# Altium footprint library Standard2.PcbLib: 423 footprints (part 8 of 27)
Each footprint in its own frame and in the unit in brackets; x right, y up, seen from the top. Pads: shape width x height; smd on the part's side, far side on the other; paste and mask are expansions set on the pad; w line width, h text height; cw(c..) or ccw(c..) is an arc to the next point about the centre after c.
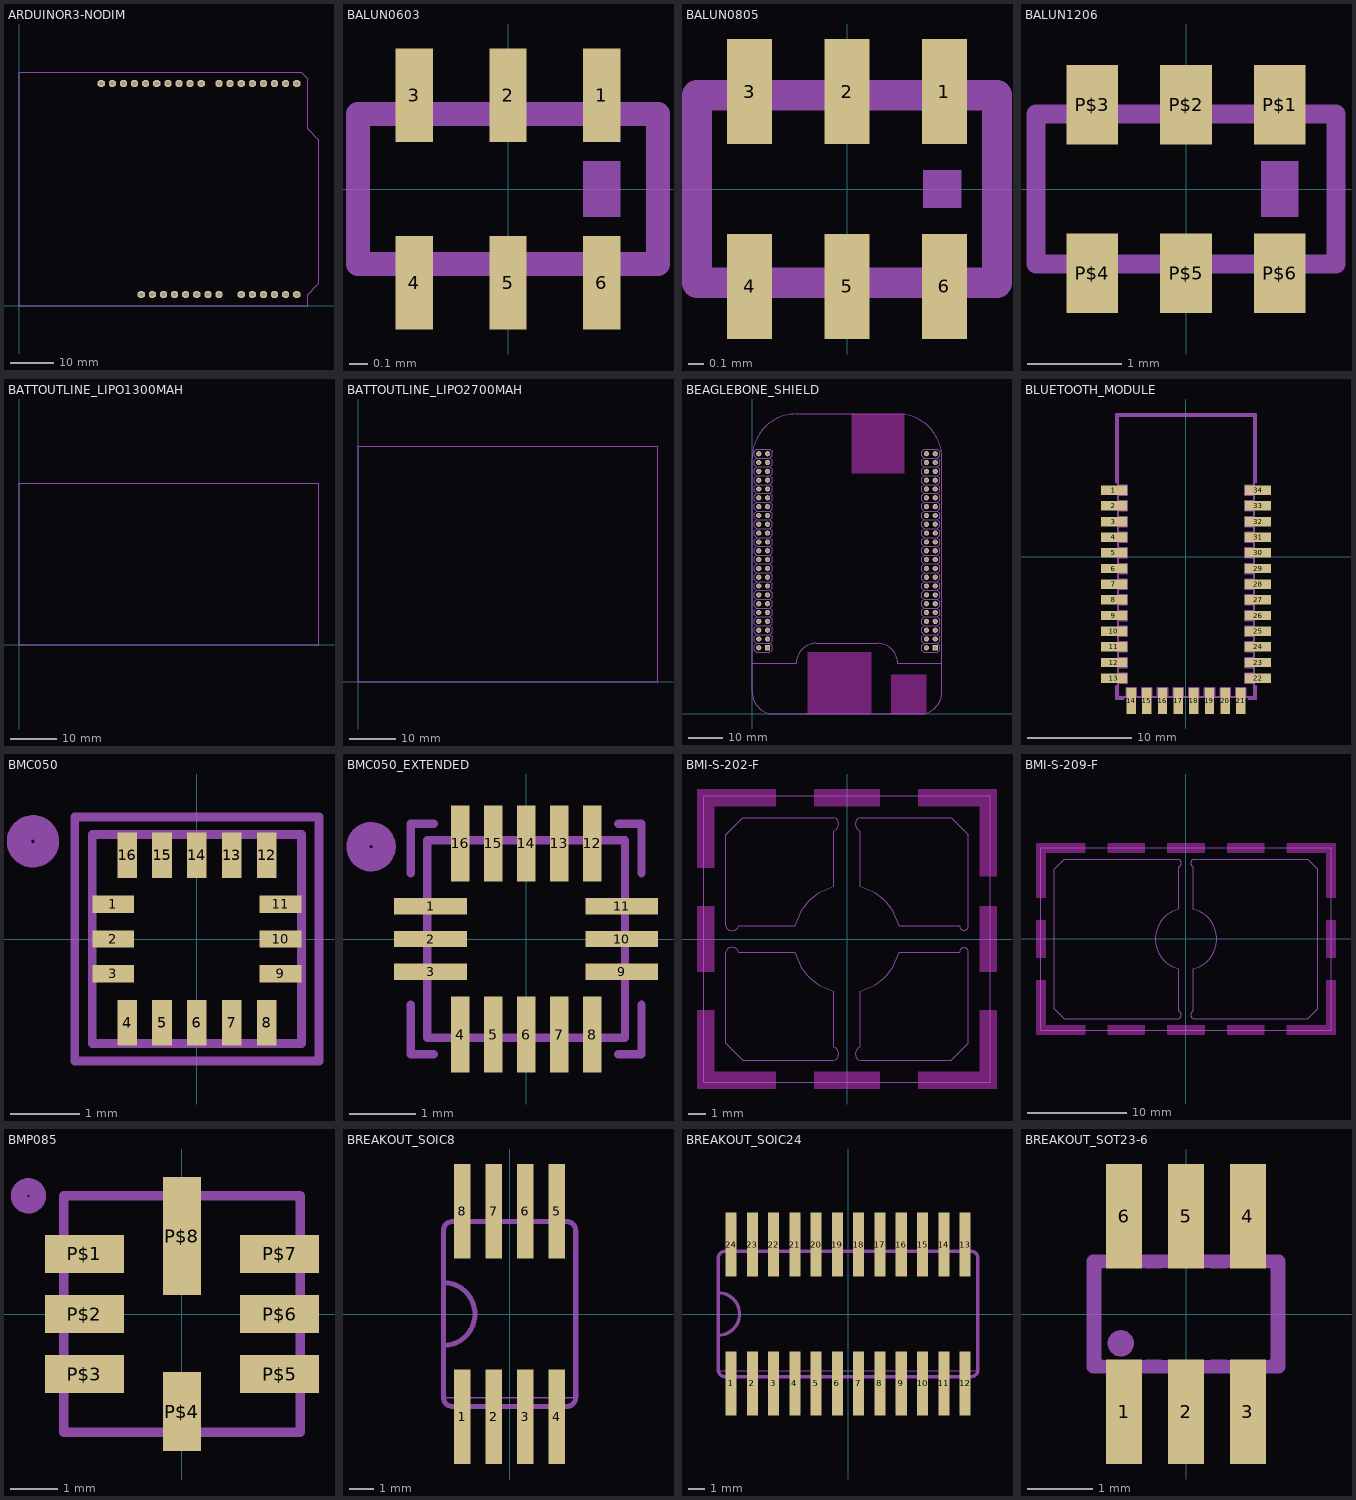
[diagram p7: the footprints below, top view; thin cyan lines are the x and y axes]

## ARDUINOR3-NODIM [mm]
pads (32):
  oct 1.623x1.623 hole 1: 3V(35.56,2.54) 5V(38.1,2.54) A0(50.8,2.54) A1(53.34,2.54) A2(55.88,2.54) A3(58.42,2.54) A4(60.96,2.54) A5(63.5,2.54) AREF(23.876,50.8) D0(63.5,50.8) D1(60.96,50.8) D2(58.42,50.8) D3(55.88,50.8) D4(53.34,50.8) D5(50.8,50.8) D6(48.26,50.8) D7(45.72,50.8) D8(41.656,50.8) D9(39.116,50.8) D10(36.576,50.8) D11(34.036,50.8) D12(31.496,50.8) D13(28.956,50.8) GND(26.416,50.8) GND1(43.18,2.54) GND2(40.64,2.54) IOREF(30.48,2.54) RESERVED(27.94,2.54) RESET(33.02,2.54) SCL(18.796,50.8) SDA(21.336,50.8) VIN(45.72,2.54)
Mechanical 18:
  lines w0: 0,0 66.04,0 66.04,2.54 68.58,5.08 68.58,37.846 66.04,40.386 66.04,51.816 64.516,53.34 0,53.34 0,0

## BALUN0603 [mm]
pads (6):
  rect 0.2x0.5 smd: 1(0.5,0.5) 2(0,0.5) 3(-0.5,0.5) 4(-0.5,-0.5) 5(0,-0.5) 6(0.5,-0.5)
Mechanical 2:
  rectangle: 0.4,-0.15 0.6,0.15
  lines w0.127: -0.8,-0.4 -0.8,0.4 ; 0.8,-0.4 0.8,0.4
Mechanical 18:
  rectangle: 0.4,-0.15 0.6,0.15
  lines w0.127: -0.8,-0.4 0.8,-0.4 0.8,0.4 -0.8,0.4 -0.8,-0.4

## BALUN0805 [mm]
pads (6):
  rect 0.3x0.7 smd: 1(0.65,0.65) 2(0,0.65) 3(-0.65,0.65) 4(-0.65,-0.65) 5(0,-0.65) 6(0.65,-0.65)
Mechanical 2:
  rectangle: 0.508,-0.127 0.762,0.127
  lines w0.203: -1,-0.625 -1,0.625 ; 1,-0.625 1,0.625
Mechanical 18:
  lines w0.127: -1,-0.625 -1,0.625 ; 1,-0.625 1,0.625
  lines w0.203: -1,-0.625 1,-0.625 ; -1,0.625 1,0.625

## BALUN1206 [mm]
pads (6):
  rect 0.55x0.85 smd: P$1(1,0.9) P$2(0,0.9) P$3(-1,0.9) P$4(-1,-0.9) P$5(0,-0.9) P$6(1,-0.9)
Mechanical 2:
  rectangle: 0.8,-0.3 1.2,0.3
  lines w0.203: -1.5,-0.8 -1.6,-0.8 -1.6,0.8 -1.5,0.8 ; 1.5,-0.8 1.6,-0.8 1.6,0.8 1.5,0.8
Mechanical 18:
  lines w0.127: -1.6,-0.8 -1.6,0.8 ; 1.6,-0.8 1.6,0.8
  lines w0.203: -1.6,-0.8 1.6,-0.8 ; -1.6,0.8 1.6,0.8

## BATTOUTLINE_LIPO1300MAH [mm]
Mechanical 2:
  lines w0.203: 0,0 0,35 65,35 65,0 0,0

## BATTOUTLINE_LIPO2700MAH [mm]
Mechanical 2:
  lines w0.203: 0,0 0,51 65,51 65,0 0,0

## BEAGLEBONE_SHIELD [mm]
pads (92):
  rect 1.5x1.5 hole 1: 1(4.445,19.05) 47(52.705,19.05)
  round 1.5 hole 1: 2(1.905,19.05) 3(4.445,21.59) 4(1.905,21.59) 5(4.445,24.13) 6(1.905,24.13) 7(4.445,26.67) 8(1.905,26.67) 9(4.445,29.21) 10(1.905,29.21) 11(4.445,31.75) 12(1.905,31.75) 13(4.445,34.29) 14(1.905,34.29) 15(4.445,36.83) 16(1.905,36.83) 17(4.445,39.37) 18(1.905,39.37) 19(4.445,41.91) 20(1.905,41.91) 21(4.445,44.45) 22(1.905,44.45) 23(4.445,46.99) 24(1.905,46.99) 25(4.445,49.53) 26(1.905,49.53) 27(4.445,52.07) 28(1.905,52.07) 29(4.445,54.61) 30(1.905,54.61) 31(4.445,57.15) 32(1.905,57.15) 33(4.445,59.69) 34(1.905,59.69) 35(4.445,62.23) 36(1.905,62.23) 37(4.445,64.77) 38(1.905,64.77) 39(4.445,67.31) 40(1.905,67.31) 41(4.445,69.85) 42(1.905,69.85) 43(4.445,72.39) 44(1.905,72.39) 45(4.445,74.93) 46(1.905,74.93) 48(50.165,19.05) 49(52.705,21.59) 50(50.165,21.59) 51(52.705,24.13) 52(50.165,24.13) 53(52.705,26.67) 54(50.165,26.67) 55(52.705,29.21) 56(50.165,29.21) 57(52.705,31.75) 58(50.165,31.75) 59(52.705,34.29) 60(50.165,34.29) 61(52.705,36.83) 62(50.165,36.83) 63(52.705,39.37) 64(50.165,39.37) 65(52.705,41.91) 66(50.165,41.91) 67(52.705,44.45) 68(50.165,44.45) 69(52.705,46.99) 70(50.165,46.99) 71(52.705,49.53) 72(50.165,49.53) 73(52.705,52.07) 74(50.165,52.07) 75(52.705,54.61) 76(50.165,54.61) 77(52.705,57.15) 78(50.165,57.15) 79(52.705,59.69) 80(50.165,59.69) 81(52.705,62.23) 82(50.165,62.23) 83(52.705,64.77) 84(50.165,64.77) 85(52.705,67.31) 86(50.165,67.31) 87(52.705,69.85) 88(50.165,69.85) 89(52.705,72.39) 90(50.165,72.39) 91(52.705,74.93) 92(50.165,74.93)
Keep-Out Layer:
  rectangle: 28.575,69.215 43.815,86.36
  rectangle: 40.005,0 50.165,11.43
  rectangle: 15.875,0 34.29,17.78
Mechanical 1:
  lines w0.127: 0,73.66 cw(c12.7,73.66) 12.7,86.36 41.91,86.36 cw(c41.91,73.66) 54.61,73.66 ; 12.7,14.605 cw(c18.415,14.605) 18.415,20.32 ; 36.195,20.32 cw(c36.195,14.605) 41.91,14.605
  lines w0.203: 0,73.66 0,14.605 12.7,14.605 ; 18.415,20.32 36.195,20.32 ; 41.91,14.605 54.61,14.605 54.61,73.66
Mechanical 2:
  drawing of 324 lines, arcs and shapes, not listed
Mechanical 18:
  region: 4.699,18.796 4.699,19.304 4.191,19.304 4.191,18.796
  region: 2.159,18.796 2.159,19.304 1.651,19.304 1.651,18.796
  region: 2.159,21.336 2.159,21.844 1.651,21.844 1.651,21.336
  region: 4.699,21.336 4.699,21.844 4.191,21.844 4.191,21.336
  region: 2.159,23.876 2.159,24.384 1.651,24.384 1.651,23.876
  region: 4.699,23.876 4.699,24.384 4.191,24.384 4.191,23.876
  region: 2.159,26.416 2.159,26.924 1.651,26.924 1.651,26.416
  region: 2.159,28.956 2.159,29.464 1.651,29.464 1.651,28.956
  region: 2.159,31.496 2.159,32.004 1.651,32.004 1.651,31.496
  region: 4.699,26.416 4.699,26.924 4.191,26.924 4.191,26.416
  region: 4.699,28.956 4.699,29.464 4.191,29.464 4.191,28.956
  region: 4.699,31.496 4.699,32.004 4.191,32.004 4.191,31.496
  region: 2.159,34.036 2.159,34.544 1.651,34.544 1.651,34.036
  region: 4.699,34.036 4.699,34.544 4.191,34.544 4.191,34.036
  region: 2.159,36.576 2.159,37.084 1.651,37.084 1.651,36.576
  region: 4.699,36.576 4.699,37.084 4.191,37.084 4.191,36.576
  region: 2.159,39.116 2.159,39.624 1.651,39.624 1.651,39.116
  region: 4.699,39.116 4.699,39.624 4.191,39.624 4.191,39.116
  region: 2.159,41.656 2.159,42.164 1.651,42.164 1.651,41.656
  region: 4.699,41.656 4.699,42.164 4.191,42.164 4.191,41.656
  region: 2.159,44.196 2.159,44.704 1.651,44.704 1.651,44.196
  region: 4.699,44.196 4.699,44.704 4.191,44.704 4.191,44.196
  region: 2.159,46.736 2.159,47.244 1.651,47.244 1.651,46.736
  region: 4.699,46.736 4.699,47.244 4.191,47.244 4.191,46.736
  region: 2.159,49.276 2.159,49.784 1.651,49.784 1.651,49.276
  region: 4.699,49.276 4.699,49.784 4.191,49.784 4.191,49.276
  region: 2.159,51.816 2.159,52.324 1.651,52.324 1.651,51.816
  region: 4.699,51.816 4.699,52.324 4.191,52.324 4.191,51.816
  region: 2.159,54.356 2.159,54.864 1.651,54.864 1.651,54.356
  region: 4.699,54.356 4.699,54.864 4.191,54.864 4.191,54.356
  region: 2.159,56.896 2.159,57.404 1.651,57.404 1.651,56.896
  region: 4.699,56.896 4.699,57.404 4.191,57.404 4.191,56.896
  region: 2.159,59.436 2.159,59.944 1.651,59.944 1.651,59.436
  region: 4.699,59.436 4.699,59.944 4.191,59.944 4.191,59.436
  region: 2.159,61.976 2.159,62.484 1.651,62.484 1.651,61.976
  region: 4.699,61.976 4.699,62.484 4.191,62.484 4.191,61.976
  region: 2.159,64.516 2.159,65.024 1.651,65.024 1.651,64.516
  region: 4.699,64.516 4.699,65.024 4.191,65.024 4.191,64.516
  region: 2.159,67.056 2.159,67.564 1.651,67.564 1.651,67.056
  region: 4.699,67.056 4.699,67.564 4.191,67.564 4.191,67.056
  region: 2.159,69.596 2.159,70.104 1.651,70.104 1.651,69.596
  region: 4.699,69.596 4.699,70.104 4.191,70.104 4.191,69.596
  region: 2.159,72.136 2.159,72.644 1.651,72.644 1.651,72.136
  region: 4.699,72.136 4.699,72.644 4.191,72.644 4.191,72.136
  region: 2.159,74.676 2.159,75.184 1.651,75.184 1.651,74.676
  region: 4.699,74.676 4.699,75.184 4.191,75.184 4.191,74.676
  region: 52.959,18.796 52.959,19.304 52.451,19.304 52.451,18.796
  region: 50.419,18.796 50.419,19.304 49.911,19.304 49.911,18.796
  region: 50.419,21.336 50.419,21.844 49.911,21.844 49.911,21.336
  region: 52.959,21.336 52.959,21.844 52.451,21.844 52.451,21.336
  region: 50.419,23.876 50.419,24.384 49.911,24.384 49.911,23.876
  region: 52.959,23.876 52.959,24.384 52.451,24.384 52.451,23.876
  region: 50.419,26.416 50.419,26.924 49.911,26.924 49.911,26.416
  region: 50.419,28.956 50.419,29.464 49.911,29.464 49.911,28.956
  region: 50.419,31.496 50.419,32.004 49.911,32.004 49.911,31.496
  region: 52.959,26.416 52.959,26.924 52.451,26.924 52.451,26.416
  region: 52.959,28.956 52.959,29.464 52.451,29.464 52.451,28.956
  region: 52.959,31.496 52.959,32.004 52.451,32.004 52.451,31.496
  region: 50.419,34.036 50.419,34.544 49.911,34.544 49.911,34.036
  region: 52.959,34.036 52.959,34.544 52.451,34.544 52.451,34.036
  region: 50.419,36.576 50.419,37.084 49.911,37.084 49.911,36.576
  region: 52.959,36.576 52.959,37.084 52.451,37.084 52.451,36.576
  region: 50.419,39.116 50.419,39.624 49.911,39.624 49.911,39.116
  region: 52.959,39.116 52.959,39.624 52.451,39.624 52.451,39.116
  region: 50.419,41.656 50.419,42.164 49.911,42.164 49.911,41.656
  region: 52.959,41.656 52.959,42.164 52.451,42.164 52.451,41.656
  region: 50.419,44.196 50.419,44.704 49.911,44.704 49.911,44.196
  region: 52.959,44.196 52.959,44.704 52.451,44.704 52.451,44.196
  region: 50.419,46.736 50.419,47.244 49.911,47.244 49.911,46.736
  region: 52.959,46.736 52.959,47.244 52.451,47.244 52.451,46.736
  region: 50.419,49.276 50.419,49.784 49.911,49.784 49.911,49.276
  region: 52.959,49.276 52.959,49.784 52.451,49.784 52.451,49.276
  region: 50.419,51.816 50.419,52.324 49.911,52.324 49.911,51.816
  region: 52.959,51.816 52.959,52.324 52.451,52.324 52.451,51.816
  region: 50.419,54.356 50.419,54.864 49.911,54.864 49.911,54.356
  region: 52.959,54.356 52.959,54.864 52.451,54.864 52.451,54.356
  region: 50.419,56.896 50.419,57.404 49.911,57.404 49.911,56.896
  region: 52.959,56.896 52.959,57.404 52.451,57.404 52.451,56.896
  region: 50.419,59.436 50.419,59.944 49.911,59.944 49.911,59.436
  region: 52.959,59.436 52.959,59.944 52.451,59.944 52.451,59.436
  region: 50.419,61.976 50.419,62.484 49.911,62.484 49.911,61.976
  region: 52.959,61.976 52.959,62.484 52.451,62.484 52.451,61.976
  region: 50.419,64.516 50.419,65.024 49.911,65.024 49.911,64.516
  region: 52.959,64.516 52.959,65.024 52.451,65.024 52.451,64.516
  region: 50.419,67.056 50.419,67.564 49.911,67.564 49.911,67.056
  region: 52.959,67.056 52.959,67.564 52.451,67.564 52.451,67.056
  region: 50.419,69.596 50.419,70.104 49.911,70.104 49.911,69.596
  region: 52.959,69.596 52.959,70.104 52.451,70.104 52.451,69.596
  region: 50.419,72.136 50.419,72.644 49.911,72.644 49.911,72.136
  region: 52.959,72.136 52.959,72.644 52.451,72.644 52.451,72.136
  region: 50.419,74.676 50.419,75.184 49.911,75.184 49.911,74.676
  region: 52.959,74.676 52.959,75.184 52.451,75.184 52.451,74.676
  lines w0.203: 0,14.605 0,6.35 ccw(c6.35,6.35) 6.35,0 48.26,0 ccw(c48.26,6.35) 54.61,6.35 54.61,14.605

## BLUETOOTH_MODULE [mm]
pads (34):
  rect 2.5x0.9 smd paste-1.25: 1(-6.9,6.35) 2(-6.9,4.85) 3(-6.9,3.35) 4(-6.9,1.85) 5(-6.9,0.35) 6(-6.9,-1.15) 7(-6.9,-2.65) 8(-6.9,-4.15) 9(-6.9,-5.65) 10(-6.9,-7.15) 11(-6.9,-8.65) 12(-6.9,-10.15) 13(-6.9,-11.65) 22(6.9,-11.65) 23(6.9,-10.15) 24(6.9,-8.65) 25(6.9,-7.15) 26(6.9,-5.65) 27(6.9,-4.15) 28(6.9,-2.65) 29(6.9,-1.15) 30(6.9,0.35) 31(6.9,1.85) 32(6.9,3.35) 33(6.9,4.85) 34(6.9,6.35)
  rect 0.9x2.5 smd paste-1.25: 14(-5.25,-13.83) 15(-3.75,-13.83) 16(-2.25,-13.83) 17(-0.75,-13.83) 18(0.75,-13.83) 19(2.25,-13.83) 20(3.75,-13.83) 21(5.25,-13.83)
Top Paste:
  rectangle: -8.15,4.4 -6.25,5.3
  rectangle: -6.25,4.65 -5.65,5.05
  rectangle: -8.15,5.9 -6.25,6.8
  rectangle: -6.25,6.15 -5.65,6.55
  rectangle: -8.15,2.9 -6.25,3.8
  rectangle: -6.25,3.15 -5.65,3.55
  rectangle: -8.15,1.4 -6.25,2.3
  rectangle: -6.25,1.65 -5.65,2.05
  rectangle: -8.15,-0.1 -6.25,0.8
  rectangle: -6.25,0.15 -5.65,0.55
  rectangle: -8.15,-1.6 -6.25,-0.7
  rectangle: -6.25,-1.35 -5.65,-0.95
  rectangle: -8.15,-3.1 -6.25,-2.2
  rectangle: -6.25,-2.85 -5.65,-2.45
  rectangle: -8.15,-4.6 -6.25,-3.7
  rectangle: -6.25,-4.35 -5.65,-3.95
  region: -4.8,-15.1 -4.8,-13.2 -5.7,-13.2 -5.7,-15.1
  region: -5.05,-13.2 -5.05,-12.6 -5.45,-12.6 -5.45,-13.2
  rectangle: -8.15,-6.1 -6.25,-5.2
  rectangle: -6.25,-5.85 -5.65,-5.45
  rectangle: -8.15,-7.6 -6.25,-6.7
  rectangle: -6.25,-7.35 -5.65,-6.95
  rectangle: -8.15,-9.1 -6.25,-8.2
  rectangle: -6.25,-8.85 -5.65,-8.45
  rectangle: -8.15,-10.6 -6.25,-9.7
  rectangle: -6.25,-10.35 -5.65,-9.95
  rectangle: -8.15,-12.1 -6.25,-11.2
  rectangle: -6.25,-11.85 -5.65,-11.45
  region: 8.15,-9.7 6.25,-9.7 6.25,-10.6 8.15,-10.6
  region: 6.25,-9.95 5.65,-9.95 5.65,-10.35 6.25,-10.35
  region: 8.15,-8.2 6.25,-8.2 6.25,-9.1 8.15,-9.1
  region: 6.25,-8.45 5.65,-8.45 5.65,-8.85 6.25,-8.85
  region: 8.15,-6.7 6.25,-6.7 6.25,-7.6 8.15,-7.6
  region: 6.25,-6.95 5.65,-6.95 5.65,-7.35 6.25,-7.35
  region: 8.15,-5.2 6.25,-5.2 6.25,-6.1 8.15,-6.1
  region: 6.25,-5.45 5.65,-5.45 5.65,-5.85 6.25,-5.85
  region: 8.15,-3.7 6.25,-3.7 6.25,-4.6 8.15,-4.6
  region: 6.25,-3.95 5.65,-3.95 5.65,-4.35 6.25,-4.35
  region: 8.15,-2.2 6.25,-2.2 6.25,-3.1 8.15,-3.1
  region: 6.25,-2.45 5.65,-2.45 5.65,-2.85 6.25,-2.85
  region: 8.15,-0.7 6.25,-0.7 6.25,-1.6 8.15,-1.6
  region: 6.25,-0.95 5.65,-0.95 5.65,-1.35 6.25,-1.35
  region: 8.15,0.8 6.25,0.8 6.25,-0.1 8.15,-0.1
  region: 6.25,0.55 5.65,0.55 5.65,0.15 6.25,0.15
  region: 8.15,2.3 6.25,2.3 6.25,1.4 8.15,1.4
  region: 6.25,2.05 5.65,2.05 5.65,1.65 6.25,1.65
  region: 8.15,3.8 6.25,3.8 6.25,2.9 8.15,2.9
  region: 6.25,3.55 5.65,3.55 5.65,3.15 6.25,3.15
  region: 8.15,5.3 6.25,5.3 6.25,4.4 8.15,4.4
  region: 6.25,5.05 5.65,5.05 5.65,4.65 6.25,4.65
  region: 8.15,6.8 6.25,6.8 6.25,5.9 8.15,5.9
  region: 6.25,6.55 5.65,6.55 5.65,6.15 6.25,6.15
  region: 8.15,-11.2 6.25,-11.2 6.25,-12.1 8.15,-12.1
  region: 6.25,-11.45 5.65,-11.45 5.65,-11.85 6.25,-11.85
  region: -3.3,-15.1 -3.3,-13.2 -4.2,-13.2 -4.2,-15.1
  region: -3.55,-13.2 -3.55,-12.6 -3.95,-12.6 -3.95,-13.2
  region: -1.8,-15.1 -1.8,-13.2 -2.7,-13.2 -2.7,-15.1
  region: -2.05,-13.2 -2.05,-12.6 -2.45,-12.6 -2.45,-13.2
  region: -0.3,-15.1 -0.3,-13.2 -1.2,-13.2 -1.2,-15.1
  region: -0.55,-13.2 -0.55,-12.6 -0.95,-12.6 -0.95,-13.2
  region: 1.2,-15.1 1.2,-13.2 0.3,-13.2 0.3,-15.1
  region: 0.95,-13.2 0.95,-12.6 0.55,-12.6 0.55,-13.2
  region: 2.7,-15.1 2.7,-13.2 1.8,-13.2 1.8,-15.1
  region: 2.45,-13.2 2.45,-12.6 2.05,-12.6 2.05,-13.2
  region: 4.2,-15.1 4.2,-13.2 3.3,-13.2 3.3,-15.1
  region: 3.95,-13.2 3.95,-12.6 3.55,-12.6 3.55,-13.2
  region: 5.7,-15.1 5.7,-13.2 4.8,-13.2 4.8,-15.1
  region: 5.45,-13.2 5.45,-12.6 5.05,-12.6 5.05,-13.2
Mechanical 2:
  lines w0.203: -6.7,-12.4 -6.7,-13.65 -6,-13.65 ; -6.7,7.1 -6.7,13.65 6.7,13.65 6.7,7.1 ; 6,-13.65 6.7,-13.65 6.7,-12.4
Mechanical 18:
  drawing of 378 lines, arcs and shapes, not listed

## BMC050 [mm]
pads (16):
  rect 0.6x0.25 smd: 1(-1.2,0.5) 2(-1.2,0) 3(-1.2,-0.5) 9(1.2,-0.5) 10(1.2,0) 11(1.2,0.5)
  rect 0.28x0.65 smd: 4(-1,-1.2) 5(-0.5,-1.2) 6(0,-1.2) 7(0.5,-1.2) 8(1,-1.2) 12(1,1.2) 13(0.5,1.2) 14(0,1.2) 15(-0.5,1.2) 16(-1,1.2)
Mechanical 2:
  circle w0.35: c-2.35,1.4 r0.2
  lines w0.127: -1.75,-1.75 1.75,-1.75 1.75,1.75 -1.75,1.75 -1.75,-1.75
Mechanical 18:
  lines w0.127: -1.5,-1.5 1.5,-1.5 1.5,1.5 -1.5,1.5 -1.5,-1.5

## BMC050_EXTENDED [mm]
pads (16):
  rect 1.1x0.25 smd: 1(-1.45,0.5) 2(-1.45,0) 3(-1.45,-0.5) 9(1.45,-0.5) 10(1.45,0) 11(1.45,0.5)
  rect 0.28x1.15 smd: 4(-1,-1.45) 5(-0.5,-1.45) 6(0,-1.45) 7(0.5,-1.45) 8(1,-1.45) 12(1,1.45) 13(0.5,1.45) 14(0,1.45) 15(-0.5,1.45) 16(-1,1.45)
Mechanical 2:
  circle w0.35: c-2.35,1.4 r0.2
  lines w0.127: -1.75,-1 -1.75,-1.75 -1.4,-1.75 ; -1.75,1 -1.75,1.75 -1.4,1.75 ; 1.4,-1.75 1.75,-1.75 1.75,-1 ; 1.4,1.75 1.75,1.75 1.75,1
Mechanical 18:
  lines w0.127: -1.5,-1.5 1.5,-1.5 1.5,1.5 -1.5,1.5 -1.5,-1.5

## BMI-S-202-F [mm]
Top Paste:
  rectangle: -8.65,-8.65 -7.65,-4.1
  rectangle: -8.65,-1.9 -7.65,1.9
  rectangle: -8.65,4.1 -7.65,8.65
  rectangle: -8.65,-8.65 -4.1,-7.65
  rectangle: -1.9,-8.65 1.9,-7.65
  rectangle: 4.1,-8.65 8.65,-7.65
  rectangle: 7.65,-8.65 8.65,-4.1
  rectangle: 7.65,-1.9 8.65,1.9
  rectangle: 7.65,3.6 8.65,8.65
  rectangle: -8.65,7.65 -4.1,8.65
  rectangle: 4.1,7.65 8.65,8.65
  rectangle: -1.9,7.65 1.9,8.65
Top Solder:
  rectangle: -8.65,-8.65 -7.65,-4.1
  rectangle: -8.65,-1.9 -7.65,1.9
  rectangle: -8.65,4.1 -7.65,8.65
  rectangle: -8.65,-8.65 -4.1,-7.65
  rectangle: -1.9,-8.65 1.9,-7.65
  rectangle: 4.1,-8.65 8.65,-7.65
  rectangle: 7.65,-8.65 8.65,-4.1
  rectangle: 7.65,-1.9 8.65,1.9
  rectangle: 7.65,3.6 8.65,8.65
  rectangle: -8.65,7.65 -4.1,8.65
  rectangle: 4.1,7.65 8.65,8.65
  rectangle: -1.9,7.65 1.9,8.65
Keep-Out Layer:
  rectangle: -8.65,-8.65 -7.65,-4.1
  rectangle: -8.65,-1.9 -7.65,1.9
  rectangle: -8.65,4.1 -7.65,8.65
  rectangle: -8.65,-8.65 -4.1,-7.65
  rectangle: -1.9,-8.65 1.9,-7.65
  rectangle: 4.1,-8.65 8.65,-7.65
  rectangle: 7.65,-8.65 8.65,-4.1
  rectangle: 7.65,-1.9 8.65,1.9
  rectangle: 7.65,3.6 8.65,8.65
  rectangle: -8.65,7.65 -4.1,8.65
  rectangle: 4.1,7.65 8.65,8.65
  rectangle: -1.9,7.65 1.9,8.65
Mechanical 18:
  lines w0: -8.25,-8.25 -8.25,8.25 8.25,8.25 8.25,-8.25 -8.25,-8.25 ; -7,-6 -7,-0.75 cw(c-6.625,-0.875) -6.25,-0.75 -3,-0.75 ccw(c0,0) -0.75,-3 -0.75,-6.25 cw(c-0.875,-6.625) -0.75,-7 -6,-7 -7,-6 ; -7,0.75 ccw(c-6.625,0.875) -6.25,0.75 -3,0.75 cw(c0,0) -0.75,3 -0.75,6.25 ccw(c-0.875,6.625) -0.75,7 -6,7 -7,6 -7,0.75 ; 0.75,-7 cw(c0.875,-6.625) 0.75,-6.25 0.75,-3 ccw(c0,0) 3,-0.75 6.5,-0.75 cw(c6.75,-0.75) 7,-0.75 7,-6 6,-7 0.75,-7 ; 0.75,3 cw(c0,0) 3,0.75 6.5,0.75 ccw(c6.75,0.75) 7,0.75 7,6 6,7 0.75,7 ccw(c0.875,6.625) 0.75,6.25 0.75,3

## BMI-S-209-F [mm]
Top Paste:
  rectangle: -15.08,-9.65 -10.1,-8.65
  rectangle: -7.9,-9.65 -4.1,-8.65
  rectangle: -1.9,-9.65 1.9,-8.65
  rectangle: 4.1,-9.65 7.9,-8.65
  rectangle: 10.1,-9.65 15.08,-8.65
  rectangle: -15.08,-9.65 -14.08,-4.1
  rectangle: -15.08,-1.9 -14.08,1.9
  rectangle: -15.08,4.1 -14.08,9.65
  rectangle: -15.08,8.65 -10.1,9.65
  rectangle: -7.9,8.65 -4.1,9.65
  rectangle: -1.9,8.65 1.9,9.65
  rectangle: 4.1,8.65 7.9,9.65
  rectangle: 10.1,8.65 15.08,9.65
  rectangle: 14.08,-9.65 15.08,-4.1
  rectangle: 14.08,4.1 15.08,9.65
  rectangle: 14.08,-1.9 15.08,1.9
Top Solder:
  rectangle: -15.08,-9.65 -10.1,-8.65
  rectangle: -7.9,-9.65 -4.1,-8.65
  rectangle: -1.9,-9.65 1.9,-8.65
  rectangle: 4.1,-9.65 7.9,-8.65
  rectangle: 10.1,-9.65 15.08,-8.65
  rectangle: -15.08,-9.65 -14.08,-4.1
  rectangle: -15.08,-1.9 -14.08,1.9
  rectangle: -15.08,4.1 -14.08,9.65
  rectangle: -15.08,8.65 -10.1,9.65
  rectangle: -7.9,8.65 -4.1,9.65
  rectangle: -1.9,8.65 1.9,9.65
  rectangle: 4.1,8.65 7.9,9.65
  rectangle: 10.1,8.65 15.08,9.65
  rectangle: 14.08,-9.65 15.08,-4.1
  rectangle: 14.08,4.1 15.08,9.65
  rectangle: 14.08,-1.9 15.08,1.9
Keep-Out Layer:
  rectangle: -15.08,-9.65 -10.1,-8.65
  rectangle: -7.9,-9.65 -4.1,-8.65
  rectangle: -1.9,-9.65 1.9,-8.65
  rectangle: 4.1,-9.65 7.9,-8.65
  rectangle: 10.1,-9.65 15.08,-8.65
  rectangle: -15.08,-9.65 -14.08,-4.1
  rectangle: -15.08,-1.9 -14.08,1.9
  rectangle: -15.08,4.1 -14.08,9.65
  rectangle: -15.08,8.65 -10.1,9.65
  rectangle: -7.9,8.65 -4.1,9.65
  rectangle: -1.9,8.65 1.9,9.65
  rectangle: 4.1,8.65 7.9,9.65
  rectangle: 10.1,8.65 15.08,9.65
  rectangle: 14.08,-9.65 15.08,-4.1
  rectangle: 14.08,4.1 15.08,9.65
  rectangle: 14.08,-1.9 15.08,1.9
Mechanical 18:
  lines w0: -14.58,-9.15 -14.58,9.15 14.58,9.15 14.58,-9.15 -14.58,-9.15 ; -13.25,-7 -12.25,-8 -0.75,-8 ccw(c-0.875,-7.625) -0.75,-7.25 -0.75,-3 cw(c0,0) -0.75,3 -0.75,7.25 ccw(c-0.875,7.625) -0.75,8 -12.25,8 -13.25,7 -13.25,-7 ; 0.75,-8 cw(c0.875,-7.625) 0.75,-7.25 0.75,-3 ccw(c0,0) 0.75,3 0.75,7.25 cw(c0.875,7.625) 0.75,8 12.25,8 13.25,7 13.25,-7 12.25,-8 0.75,-8

## BMP085 [mil]
pads (8):
  rect 65.75x31.5 smd: P$1(-81.3,50) P$2(-81.3,0) P$3(-81.3,-50) P$5(81.3,-50) P$6(81.3,0) P$7(81.3,50)
  rect 31.5x65.75 smd: P$4(0,-81.3)
  rect 31.5x98.43 smd: P$8(0,64.96)
Mechanical 2:
  circle w13.78: c-127.95,98.43 r7.87
  lines w8: -98.43,-78.74 -98.43,-98.43 -29.53,-98.43 ; -98.43,78.74 -98.43,98.43 -29.53,98.43 ; 29.53,-98.43 98.43,-98.43 98.43,-78.74 ; 29.53,98.43 98.43,98.43 98.43,78.74
Mechanical 18:
  lines w8: -98.43,-98.43 98.43,-98.43 98.43,98.43 -98.43,98.43 -98.43,-98.43

## BREAKOUT_SOIC8 [mil]
pads (8):
  rect 26x150 smd: 1(-75,-163) 2(-25,-163) 3(25,-163) 4(75,-163) 5(75,163) 6(25,163) 7(-25,163) 8(-75,163)
Mechanical 18:
  rectangle: -85,-152 -65,-147
  rectangle: -85,-210 -65,-152
  rectangle: -35,-152 -15,-147
  rectangle: -35,-210 -15,-152
  rectangle: 15,-152 35,-147
  rectangle: 15,-210 35,-152
  rectangle: 65,-152 85,-147
  rectangle: 65,-210 85,-152
  rectangle: -85,152 -65,210
  rectangle: -85,147 -65,152
  rectangle: -35,147 -15,152
  rectangle: -35,152 -15,210
  rectangle: 15,147 35,152
  rectangle: 15,152 35,210
  rectangle: 65,147 85,152
  rectangle: 65,152 85,210
  lines w2: -105,-133 105,-133
  lines w8: -105,-50 ccw(c-105,0) -105,50 ; -105,-50 -105,50 ; -105,-50 -105,-132 ccw(c-90,-132) -90,-147 90,-147 ccw(c90,-132) 105,-132 105,132 ccw(c90,132) 90,147 -90,147 ccw(c-90,132) -105,132 -105,50

## BREAKOUT_SOIC24 [mil]
pads (24):
  rect 26x150 smd: 1(-275,-163) 2(-225,-163) 3(-175,-163) 4(-125,-163) 5(-75,-163) 6(-25,-163) 7(25,-163) 8(75,-163) 9(125,-163) 10(175,-163) 11(225,-163) 12(275,-163) 13(275,163) 14(225,163) 15(175,163) 16(125,163) 17(75,163) 18(25,163) 19(-25,163) 20(-75,163) 21(-125,163) 22(-175,163) 23(-225,163) 24(-275,163)
Mechanical 18:
  rectangle: -285,-152 -265,-147
  rectangle: -285,-210 -265,-152
  rectangle: -235,-152 -215,-147
  rectangle: -235,-210 -215,-152
  rectangle: -185,-152 -165,-147
  rectangle: -185,-210 -165,-152
  rectangle: -135,-152 -115,-147
  rectangle: -135,-210 -115,-152
  rectangle: -85,-210 -65,-152
  rectangle: -85,-152 -65,-147
  rectangle: -35,-152 -15,-147
  rectangle: -35,-210 -15,-152
  rectangle: 15,-152 35,-147
  rectangle: 15,-210 35,-152
  rectangle: 65,-152 85,-147
  rectangle: 65,-210 85,-152
  rectangle: -285,152 -265,210
  rectangle: -285,147 -265,152
  rectangle: -235,147 -215,152
  rectangle: -235,152 -215,210
  rectangle: -185,147 -165,152
  rectangle: -185,152 -165,210
  rectangle: -135,147 -115,152
  rectangle: -135,152 -115,210
  rectangle: -85,147 -65,152
  rectangle: -85,152 -65,210
  rectangle: -35,147 -15,152
  rectangle: -35,152 -15,210
  rectangle: 15,147 35,152
  rectangle: 15,152 35,210
  rectangle: 65,147 85,152
  rectangle: 65,152 85,210
  rectangle: 115,147 135,152
  rectangle: 165,147 185,152
  rectangle: 215,147 235,152
  rectangle: 265,147 285,152
  rectangle: 115,152 135,210
  rectangle: 165,152 185,210
  rectangle: 215,152 235,210
  rectangle: 265,152 285,210
  rectangle: 115,-152 135,-147
  rectangle: 165,-152 185,-147
  rectangle: 215,-152 235,-147
  rectangle: 265,-152 285,-147
  rectangle: 115,-210 135,-152
  rectangle: 165,-210 185,-152
  rectangle: 215,-210 235,-152
  rectangle: 265,-210 285,-152
  lines w2: -305,-133 305,-133
  lines w8: -305,-50 ccw(c-305,0) -305,50 ; -305,-50 -305,50 ; -305,-50 -305,-132 ccw(c-290,-132) -290,-147 290,-147 ccw(c290,-132) 305,-132 305,132 ccw(c290,132) 290,147 -290,147 ccw(c-290,132) -305,132 -305,50

## BREAKOUT_SOT23-6 [mm]
pads (6):
  rect 0.55x1.6 smd: 1(-0.95,-1.5) 2(0,-1.5) 3(0.95,-1.5) 4(0.95,1.5) 5(0,1.5) 6(-0.95,1.5)
Mechanical 2:
  circle w0.203: c-1,-0.45 r0.1
  lines w0.203: -1.3,-0.8 -1.4,-0.8 -1.4,0.8 -1.3,0.8 ; -0.6,-0.8 -0.4,-0.8 ; -0.6,0.8 -0.4,0.8 ; 0.4,-0.8 0.6,-0.8 ; 0.4,0.8 0.6,0.8 ; 1.3,-0.8 1.4,-0.8 1.4,0.8 1.3,0.8
Mechanical 18:
  rectangle: -1.2,0.85 -0.7,1.5
  rectangle: -0.25,0.85 0.25,1.5
  rectangle: 0.7,0.85 1.2,1.5
  rectangle: 0.7,-1.5 1.2,-0.85
  rectangle: -0.25,-1.5 0.25,-0.85
  rectangle: -1.2,-1.5 -0.7,-0.85
  lines w0.203: -1.422,-0.81 -1.422,0.81 1.422,0.81 1.422,-0.81 -1.422,-0.81